# Altium footprint library lib_datalogger.PcbLib: 866 footprints (part 30 of 55)
Each footprint in its own frame and in the unit in brackets; x right, y up, seen from the top. Pads: shape width x height; smd on the part's side, far side on the other; paste and mask are expansions set on the pad; w line width, h text height; cw(c..) or ccw(c..) is an arc to the next point about the centre after c.
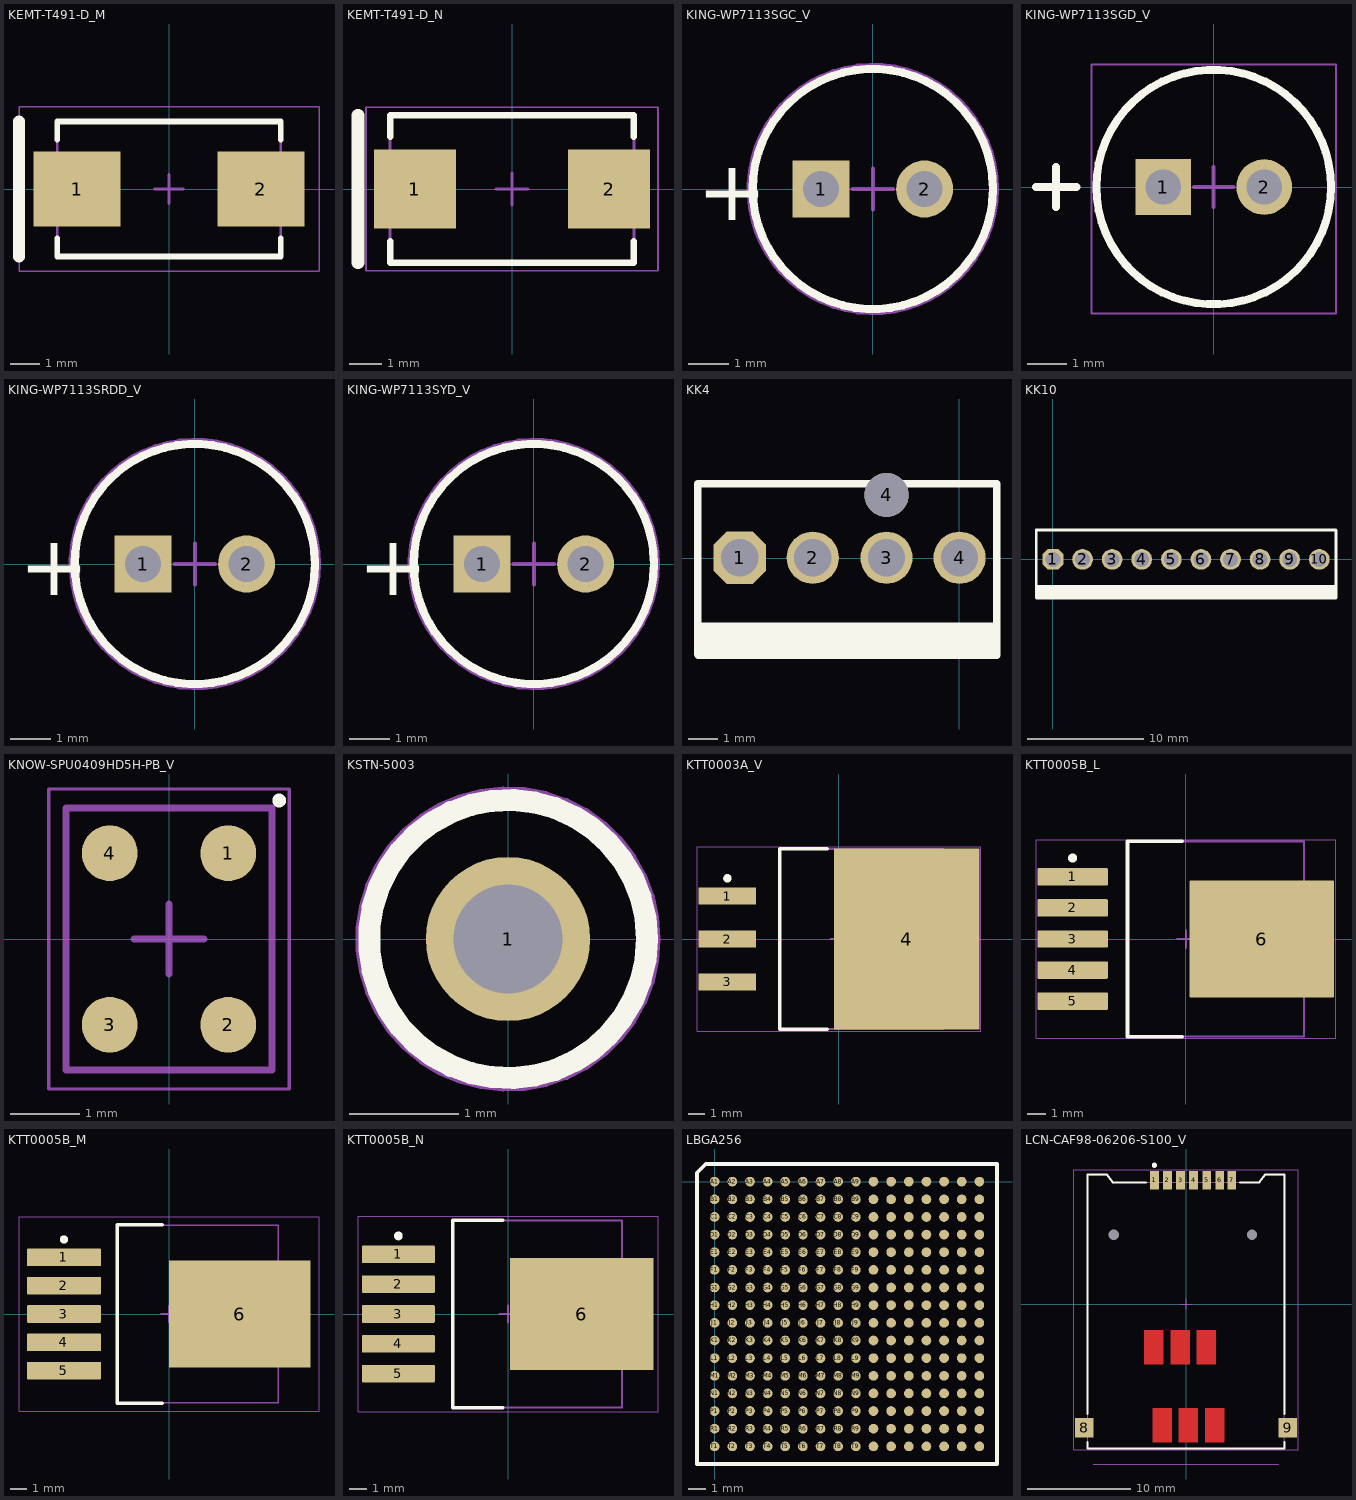
[diagram p29: the footprints below, top view; thin cyan lines are the x and y axes]

## KEMT-T491-D_M [mm] "Molded Capacitor, 2-Leads, Body 7.60x4.60mm, IPC Low Density"
height 3.1
pads (2):
  rect 2.95x2.55 smd: 1(-3.125,0) 2(3.125,0)
Top Overlay:
  lines w0.2: -3.8,-1.675 -3.8,-2.3 3.8,-2.3 3.8,-1.675 ; -3.8,1.675 -3.8,2.3 3.8,2.3 3.8,1.675
  lines w0.4: -5.1,-2.3 -5.1,2.3
Mechanical 13:
  lines w0.1: -3.8,-2.3 -3.8,2.3 3.8,2.3 3.8,-2.3 -3.8,-2.3
Mechanical 15:
  lines w0.05: -5.1,-2.8 -5.1,2.8 5.1,2.8 5.1,-2.8 -5.1,-2.8
  lines w0.1: -0.5,0 0.5,0 ; 0,-0.5 0,0.5
3D body "T491D476M006AT.step": height 3.1, standoff 0, extent -3.8,-2.3 3.8,2.3

## KEMT-T491-D_N [mm] "Molded Capacitor, 2-Leads, Body 7.60x4.60mm, IPC Medium Density"
height 3.1
pads (2):
  rect 2.55x2.45 smd: 1(-3.025,0) 2(3.025,0)
Top Overlay:
  lines w0.2: -3.8,-1.625 -3.8,-2.3 3.8,-2.3 3.8,-1.625 ; -3.8,1.625 -3.8,2.3 3.8,2.3 3.8,1.625
  lines w0.4: -4.8,-2.3 -4.8,2.3
Mechanical 13:
  lines w0.1: -3.8,-2.3 -3.8,2.3 3.8,2.3 3.8,-2.3 -3.8,-2.3
Mechanical 15:
  lines w0.05: -4.55,-2.55 -4.55,2.55 4.55,2.55 4.55,-2.55 -4.55,-2.55
  lines w0.1: -0.5,0 0.5,0 ; 0,-0.5 0,0.5
3D body "T491D476M006AT.step": height 3.1, standoff 0, extent -3.8,-2.3 3.8,2.3

## KING-WP7113SGC_V [mm] "THD, 2-Leads, Dia 5.9mm, Body Length 8.6mm"
height 15.5
pads (2):
  rect 1.4x1.4 hole 0.889: 1(-1.27,0)
  round 1.4 hole 0.889: 2(1.27,0)
Top Overlay:
  circle w0.2: c0,0 r2.95
  text "+" at -4.318,-0.762 h1.5
Mechanical 13:
  circle w0.1: c0,0 r2.95
Mechanical 15:
  circle w0.1: c0,0 r3.05
  lines w0.1: -0.5,0 0.5,0 ; 0,-0.5 0,0.5
3D body "WP7113.STEP": height 15.5, standoff -20.1, extent -2.95,-2.95 2.5,2.95

## KING-WP7113SGD_V [mm] "THD, 2-Leads, Dia 5.9mm, Body Length 8.6mm"
height 15.5
pads (2):
  rect 1.4x1.4 hole 0.889: 1(-1.27,0)
  round 1.4 hole 0.889: 2(1.27,0)
Top Overlay:
  circle w0.2: c0,0 r2.95
  lines w0.2: -4.466,0 -3.45,0 ; -3.958,-0.508 -3.958,-0.254 -3.958,0.254 -3.958,0.508
Mechanical 13:
  circle w0.1: c0,0 r2.95
Mechanical 15:
  lines w0.05: -3.075,-3.175 3.075,-3.175 3.075,3.075 -3.075,3.075 -3.075,-3.175
  lines w0.1: -0.5,0 0.5,0 ; 0,-0.5 0,0.5
3D body "WP7113.STEP": height 15.5, standoff -20.1, extent -2.95,-2.95 2.5,2.95

## KING-WP7113SRDD_V [mm] "THD, 2-Leads, Dia 5.9mm, Body Length 8.6mm"
height 15.5
pads (2):
  rect 1.4x1.4 hole 0.889: 1(-1.27,0)
  round 1.4 hole 0.889: 2(1.27,0)
Top Overlay:
  circle w0.2: c0,0 r2.95
  text "+" at -4.318,-0.762 h1.5
Mechanical 13:
  circle w0.1: c0,0 r2.95
Mechanical 15:
  circle w0.1: c0,0 r3.05
  lines w0.1: -0.5,0 0.5,0 ; 0,-0.5 0,0.5
3D body "WP7113.STEP": height 15.5, standoff -20.1, extent -2.95,-2.95 2.5,2.95

## KING-WP7113SYD_V [mm] "THD, 2-Leads, Dia 5.9mm, Body Length 8.6mm"
height 15.5
pads (2):
  rect 1.4x1.4 hole 0.889: 1(-1.27,0)
  round 1.4 hole 0.889: 2(1.27,0)
Top Overlay:
  circle w0.2: c0,0 r2.95
  text "+" at -4.318,-0.762 h1.5
Mechanical 13:
  circle w0.1: c0,0 r2.95
Mechanical 15:
  circle w0.1: c0,0 r3.05
  lines w0.1: -0.5,0 0.5,0 ; 0,-0.5 0,0.5
3D body "WP7113.STEP": height 15.5, standoff -20.1, extent -2.95,-2.95 2.5,2.95

## KK4 [mil]
height 23.62
pads (5):
  oct 70x70 hole 50: 1(-294.3,0.7)
  round 70 hole 50: 2(-196.3,0.7) 3(-97.3,0.7) 4(0.7,0.7)
  round 59.06 hole 59.06: 4(-97.3,85.04)
Top Overlay:
  region: -351.6,-128.3 -351.6,-86.3 50.3,-86.3 50.3,-128.3
  lines w10: -350.79,-128.8 -350.79,99.4 ; -350.4,100 50.3,100 ; -349.8,-129.92 50.9,-129.92 ; 50.79,-128.8 50.79,100
3D body "470531000.stp": height 393.7, standoff -137.8, extent -350.85,-129.66 50.72,100.26

## KK10 [mil] "Chip Resistor; Body 1.6 x 0.8 mm (LxW typ)"
height 53.15
pads (10):
  oct 70x70 hole 50: 1(0,0)
  round 70 hole 50: 2(100,0) 3(200,0) 4(300,0) 6(500,0) 7(600,0) 8(700,0) 9(800,0) 10(900,0)
  round 70 hole 50 paste+0: 5(400,0)
Top Overlay:
  region: -57.3,-129 -57.3,-87 956.49,-87 956.49,-129
  lines w10: -56.49,-129.5 -56.49,98.7 ; -56.1,99.3 956.49,99.3 956.49,-130.62 -55.5,-130.62
3D body "022112102.stp": height 436.24, standoff -123.76, extent -47,-127 947,123

## KNOW-SPU0409HD5H-PB_V [mm] "SMD, 4-Leads, Body 3.76x2.95mm"
height 1
pads (4):
  round 0.8 smd paste-1: 1(0.85,1.23) 4(-0.85,1.23)
  round 0.8 smd paste+0: 2(0.85,-1.23) 3(-0.85,-1.23)
Top Overlay:
  circle w0.1: c1.58,1.985 r0.05
Top Paste:
  region: -0.85,1.63 -0.888,1.628 -0.926,1.623 -0.966,1.613 -1.002,1.6 -1.038,1.583 -1.073,1.562 -1.106,1.538 -1.134,1.512 -1.161,1.482 -1.184,1.45 -1.205,1.414 -1.222,1.377 -1.234,1.342 -1.243,1.305 -1.248,1.268 -1.25,1.23 -1.248,1.193 -1.243,1.156 -1.234,1.119 -1.222,1.084 -1.207,1.051 -1.19,1.019 -1.168,0.987 -1.144,0.958 -1.114,0.93 -1.082,0.904 -1.048,0.883 -1.012,0.864 -0.973,0.85 -0.933,0.839 -0.913,0.835 -0.892,0.833 -0.874,0.831 -0.85,0.83 -0.825,0.831 -0.799,0.834 -0.774,0.838 -0.749,0.843 -0.724,0.85 -0.699,0.86 -0.674,0.871 -0.651,0.883 -0.627,0.898 -0.604,0.914 -0.583,0.933 -0.561,0.953 -0.544,0.972 -0.529,0.992 -0.514,1.013 -0.5,1.036 -0.5,1.424 -0.513,1.446 -0.528,1.467 -0.544,1.488 -0.562,1.508 -0.581,1.526 -0.602,1.544 -0.624,1.56 -0.646,1.574 -0.669,1.587 -0.694,1.598 -0.719,1.608 -0.745,1.616 -0.77,1.622 -0.797,1.627 -0.823,1.629
  region: 0.85,1.63 0.888,1.628 0.927,1.623 0.966,1.613 1.002,1.6 1.038,1.583 1.073,1.562 1.106,1.538 1.134,1.512 1.161,1.482 1.184,1.45 1.205,1.414 1.222,1.377 1.234,1.342 1.243,1.305 1.248,1.268 1.25,1.23 1.248,1.193 1.243,1.156 1.234,1.119 1.222,1.084 1.207,1.051 1.19,1.019 1.168,0.987 1.144,0.958 1.114,0.93 1.082,0.904 1.048,0.883 1.012,0.864 0.973,0.85 0.933,0.839 0.913,0.835 0.892,0.833 0.874,0.831 0.85,0.83 0.826,0.831 0.799,0.834 0.774,0.838 0.749,0.843 0.725,0.85 0.699,0.86 0.674,0.871 0.651,0.883 0.627,0.898 0.604,0.914 0.583,0.933 0.561,0.953 0.544,0.972 0.529,0.992 0.514,1.013 0.5,1.036 0.5,1.424 0.513,1.446 0.528,1.467 0.544,1.488 0.562,1.508 0.581,1.526 0.602,1.544 0.624,1.56 0.646,1.574 0.669,1.587 0.694,1.598 0.719,1.608 0.745,1.616 0.77,1.622 0.797,1.627 0.824,1.629
Mechanical 13:
  lines w0.1: -1.475,-1.88 -1.475,1.88 1.475,1.88 1.475,-1.88 -1.475,-1.88
Mechanical 15:
  lines w0.05: -1.725,-2.15 -1.725,2.15 1.725,2.15 1.725,-2.15 -1.725,-2.15
  lines w0.1: -0.5,0 0.5,0 ; 0,-0.5 0,0.5
3D body: height 0.9, standoff 0, extent -0.235,0.45 0.265,0.95
3D body: height 0.9, standoff 0, extent -1.475,-1.88 1.475,1.88

## KSTN-5003 [mm] "Test Point, Through Hole, Dia 2.54mm"
height 4.57
pads (1):
  round 1.5 hole 1: 1(0,0)
Top Overlay:
  circle w0.2: c0,0 r1.27
Mechanical 13:
  circle w0.1: c0,0 r1.27
Mechanical 15:
  circle w0.05: c0,0 r1.37
  lines w0.1: -0.5,0 0.5,0 ; 0,-0.5 0,0.5
3D body "User Library-Test Point Keystone - 5003 ORANGE.STEP": height 4.57, standoff -3.05, extent -1.27,-1.27 1.27,1.27

## KTT0003A_V [mm] "DPAK, 3-Leads, Body 10.65x9.65mm, Pitch 2.54mm"
height 4.83
pads (4):
  rect 3.4x1 smd: 1(-6.6,2.54) 2(-6.6,0) 3(-6.6,-2.54)
  rect 8.6x10.7 smd: 4(4,0)
Top Overlay:
  circle w0.25: c-6.6,3.59 r0.125
  lines w0.2: -0.7,-5.35 -3.5,-5.35 -3.5,5.35 -0.7,5.35
Mechanical 13:
  lines w0.1: -3.5,-5.325 -3.5,5.325 6.15,5.325 6.15,-5.325 -3.5,-5.325
Mechanical 15:
  lines w0.05: -8.4,-5.45 -8.4,5.45 8.4,5.45 8.4,-5.45 -8.4,-5.45
  lines w0.1: -0.5,0 0.5,0 ; 0,-0.5 0,0.5
3D body "DPAK254P1524X483-4L.step": height 4.83, standoff 0, extent -6.68,-5.325 8.56,5.325

## KTT0005B_L [mm] "DPAK, 5-Leads, Body 10.65x9.65mm, Pitch 1.7mm, IPC High Density"
height 4.83
pads (6):
  rrect11% 3.85x0.95 smd: 1(-6.2,3.4) 2(-6.2,1.7) 3(-6.2,0) 4(-6.2,-1.7) 5(-6.2,-3.4)
  rrect2% 7.9x6.4 smd: 6(4.15,0)
Top Overlay:
  circle w0.25: c-6.2,4.425 r0.125
  lines w0.2: -0.2,-5.35 -3.2,-5.35 -3.2,5.35 -0.2,5.35
Mechanical 1:
  text ".Designator" at -1.905,-0.508 h1.3
Mechanical 13:
  lines w0.1: -3.2,-5.325 6.45,-5.325 6.45,5.325 -3.2,5.325 -3.2,-5.325
Mechanical 15:
  lines w0.05: -8.2,-5.425 8.2,-5.425 8.2,5.425 -8.2,5.425 -8.2,-5.425
  lines w0.1: -0.5,0 0.5,0 ; 0,-0.5 0,0.5
3D body: height 4.83, standoff 0, extent -3.2,-5.325 6.45,5.325

## KTT0005B_M [mm] "DPAK, 5-Leads, Body 10.65x9.65mm, Pitch 1.7mm, IPC Low Density"
height 4.83
pads (6):
  rrect10% 4.45x1.05 smd: 1(-6.3,3.4) 2(-6.3,1.7) 3(-6.3,0) 4(-6.3,-1.7) 5(-6.3,-3.4)
  rrect2% 8.5x6.45 smd: 6(4.25,0)
Top Overlay:
  circle w0.25: c-6.3,4.475 r0.125
  lines w0.2: -0.4,-5.35 -3.1,-5.35 -3.1,5.35 -0.4,5.35
Mechanical 1:
  text ".Designator" at -1.905,-0.635 h1.3
Mechanical 13:
  lines w0.1: -3.1,-5.325 6.55,-5.325 6.55,5.325 -3.1,5.325 -3.1,-5.325
Mechanical 15:
  lines w0.05: -9,-5.825 9,-5.825 9,5.825 -9,5.825 -9,-5.825
  lines w0.1: -0.5,0 0.5,0 ; 0,-0.5 0,0.5
3D body: height 4.83, standoff 0, extent -3.1,-5.325 6.55,5.325

## KTT0005B_N [mm] "DPAK, 5-Leads, Body 10.65x9.65mm, Pitch 1.7mm, IPC Medium Density"
height 4.83
pads (6):
  rrect10% 4.15x1 smd: 1(-6.25,3.4) 2(-6.25,1.7) 3(-6.25,0) 4(-6.25,-1.7) 5(-6.25,-3.4)
  rrect2% 8.2x6.4 smd: 6(4.2,0)
Top Overlay:
  circle w0.25: c-6.25,4.45 r0.125
  lines w0.2: -0.3,-5.35 -3.15,-5.35 -3.15,5.35 -0.3,5.35
Mechanical 1:
  text ".Designator" at -1.905,-0.508 h1.3
Mechanical 13:
  lines w0.1: -3.15,-5.325 6.5,-5.325 6.5,5.325 -3.15,5.325 -3.15,-5.325
Mechanical 15:
  lines w0.05: -8.55,-5.575 8.55,-5.575 8.55,5.575 -8.55,5.575 -8.55,-5.575
  lines w0.1: -0.5,0 0.5,0 ; 0,-0.5 0,0.5
3D body: height 4.83, standoff 0, extent -3.15,-5.325 6.5,5.325

## LBGA256 [mm] "LBGA256: plastic low profile ball grid array package; 256 balls; body 17 x 17 x 1 mm"
height 1
pads (256):
  round 0.55 smd: A1(0,0) A2(1,0) A3(2,0) A4(3,0) A5(4,0) A6(5,0) A7(6,0) A8(7,0) A9(8,0) A10(9,0) A11(10,0) A12(11,0) A13(12,0) A14(13,0) A15(14,0) A16(15,0) B1(0,-1) B2(1,-1) B3(2,-1) B4(3,-1) B5(4,-1) B6(5,-1) B7(6,-1) B8(7,-1) B9(8,-1) B10(9,-1) B11(10,-1) B12(11,-1) B13(12,-1) B14(13,-1) B15(14,-1) B16(15,-1) C1(0,-2) C2(1,-2) C3(2,-2) C4(3,-2) C5(4,-2) C6(5,-2) C7(6,-2) C8(7,-2) C9(8,-2) C10(9,-2) C11(10,-2) C12(11,-2) C13(12,-2) C14(13,-2) C15(14,-2) C16(15,-2) D1(0,-3) D2(1,-3) D3(2,-3) D4(3,-3) D5(4,-3) D6(5,-3) D7(6,-3) D8(7,-3) D9(8,-3) D10(9,-3) D11(10,-3) D12(11,-3) D13(12,-3) D14(13,-3) D15(14,-3) D16(15,-3) E1(0,-4) E2(1,-4) E3(2,-4) E4(3,-4) E5(4,-4) E6(5,-4) E7(6,-4) E8(7,-4) E9(8,-4) E10(9,-4) E11(10,-4) E12(11,-4) E13(12,-4) E14(13,-4) E15(14,-4) E16(15,-4) F1(0,-5) F2(1,-5) F3(2,-5) F4(3,-5) F5(4,-5) F6(5,-5) F7(6,-5) F8(7,-5) F9(8,-5) F10(9,-5) F11(10,-5) F12(11,-5) F13(12,-5) F14(13,-5) F15(14,-5) F16(15,-5) G1(0,-6) G2(1,-6) G3(2,-6) G4(3,-6) G5(4,-6) G6(5,-6) G7(6,-6) G8(7,-6) G9(8,-6) G10(9,-6) G11(10,-6) G12(11,-6) G13(12,-6) G14(13,-6) G15(14,-6) G16(15,-6) H1(0,-7) H2(1,-7) H3(2,-7) H4(3,-7) H5(4,-7) H6(5,-7) H7(6,-7) H8(7,-7) H9(8,-7) H10(9,-7) H11(10,-7) H12(11,-7) H13(12,-7) H14(13,-7) H15(14,-7) H16(15,-7) J1(0,-8) J2(1,-8) J3(2,-8) J4(3,-8) J5(4,-8) J6(5,-8) J7(6,-8) J8(7,-8) J9(8,-8) J10(9,-8) J11(10,-8) J12(11,-8) J13(12,-8) J14(13,-8) J15(14,-8) J16(15,-8) K1(0,-9) K2(1,-9) K3(2,-9) K4(3,-9) K5(4,-9) K6(5,-9) K7(6,-9) K8(7,-9) K9(8,-9) K10(9,-9) K11(10,-9) K12(11,-9) K13(12,-9) K14(13,-9) K15(14,-9) K16(15,-9) L1(0,-10) L2(1,-10) L3(2,-10) L4(3,-10) L5(4,-10) L6(5,-10) L7(6,-10) L8(7,-10) L9(8,-10) L10(9,-10) L11(10,-10) L12(11,-10) L13(12,-10) L14(13,-10) L15(14,-10) L16(15,-10) M1(0,-11) M2(1,-11) M3(2,-11) M4(3,-11) M5(4,-11) M6(5,-11) M7(6,-11) M8(7,-11) M9(8,-11) M10(9,-11) M11(10,-11) M12(11,-11) M13(12,-11) M14(13,-11) M15(14,-11) M16(15,-11) N1(0,-12) N2(1,-12) N3(2,-12) N4(3,-12) N5(4,-12) N6(5,-12) N7(6,-12) N8(7,-12) N9(8,-12) N10(9,-12) N11(10,-12) N12(11,-12) N13(12,-12) N14(13,-12) N15(14,-12) N16(15,-12) P1(0,-13) P2(1,-13) P3(2,-13) P4(3,-13) P5(4,-13) P6(5,-13) P7(6,-13) P8(7,-13) P9(8,-13) P10(9,-13) P11(10,-13) P12(11,-13) P13(12,-13) P14(13,-13) P15(14,-13) P16(15,-13) R1(0,-14) R2(1,-14) R3(2,-14) R4(3,-14) R5(4,-14) R6(5,-14) R7(6,-14) R8(7,-14) R9(8,-14) R10(9,-14) R11(10,-14) R12(11,-14) R13(12,-14) R14(13,-14) R15(14,-14) R16(15,-14) T1(0,-15) T2(1,-15) T3(2,-15) T4(3,-15) T5(4,-15) T6(5,-15) T7(6,-15) T8(7,-15) T9(8,-15) T10(9,-15) T11(10,-15) T12(11,-15) T13(12,-15) T14(13,-15) T15(14,-15) T16(15,-15)
Top Overlay:
  lines w0.2: -1,-16 -1,0.5 -0.5,1 16,1 16,-16 -1,-16
3D body "BGA 256 17x17mm 1mm pitch.step": height 1.73, standoff -0.02, extent -1,-16 16,1

## LCN-CAF98-06206-S100_V [mm] "SMD, 9-Leads, Body 26.6x19.1mm"
height 2.3
pads (11):
  rect 0.85x1.8 smd: 1(-3.07,12.025) 2(-1.8,12.025) 3(-0.53,12.025) 4(0.74,12.025) 5(2.01,12.025) 6(3.28,12.025) 7(4.43,12.025)
  rect 1.8x1.9 smd: 8(-9.9,-12.025) 9(9.9,-12.025)
  round 0.7 hole 1 unplated: ""(-7,6.725) ""(6.4,6.725)
Top Layer:
  pour cut-out: 3.705,-13.425 1.855,-13.425 1.855,-10.125 3.705,-10.125
  pour cut-out: -1.495,-5.825 0.355,-5.825 0.355,-2.525 -1.495,-2.525
  pour cut-out: 2.895,-5.825 1.045,-5.825 1.045,-2.525 2.895,-2.525
  pour cut-out: -1.375,-13.425 -3.225,-13.425 -3.225,-10.125 -1.375,-10.125
  pour cut-out: -2.185,-5.825 -4.035,-5.825 -4.035,-2.525 -2.185,-2.525
  pour cut-out: -0.685,-13.425 1.165,-13.425 1.165,-10.125 -0.685,-10.125
Top Overlay:
  circle w0.25: c-3.07,13.475 r0.125
  lines w0.2: -9.55,-13.375 -9.55,-14.025 9.55,-14.025 9.55,-13.375 ; -9.55,-10.675 -9.55,12.575 -7.671,12.575 -7.112,11.825 -3.895,11.825 ; 5.255,11.825 7.112,11.825 7.671,12.575 9.55,12.575 9.55,-10.675
Mechanical 1:
  lines w0.1: -9,-15.525 9,-15.525
  text "Board Edge" at -3.556,-15.24 h1
Mechanical 13:
  lines w0.1: -9.55,-14.025 9.55,-14.025 9.55,12.575 7.671,12.575 7.112,11.825 -7.112,11.825 -7.671,12.575 -9.55,12.575 -9.55,-14.025
Mechanical 15:
  lines w0.05: -10.9,-14.125 -10.9,13.025 10.9,13.025 10.9,-14.125 -10.9,-14.125
  lines w0.1: -0.5,0 0.5,0 ; 0,-0.5 0,0.5
3D body "simcard.STEP": height 2, standoff -0.75, extent -10.45,-14.025 10.45,12.575